# Altium footprint library lib_datalogger.PcbLib: 866 footprints (part 4 of 55)
Each footprint in its own frame and in the unit in brackets; x right, y up, seen from the top. Pads: shape width x height; smd on the part's side, far side on the other; paste and mask are expansions set on the pad; w line width, h text height; cw(c..) or ccw(c..) is an arc to the next point about the centre after c.
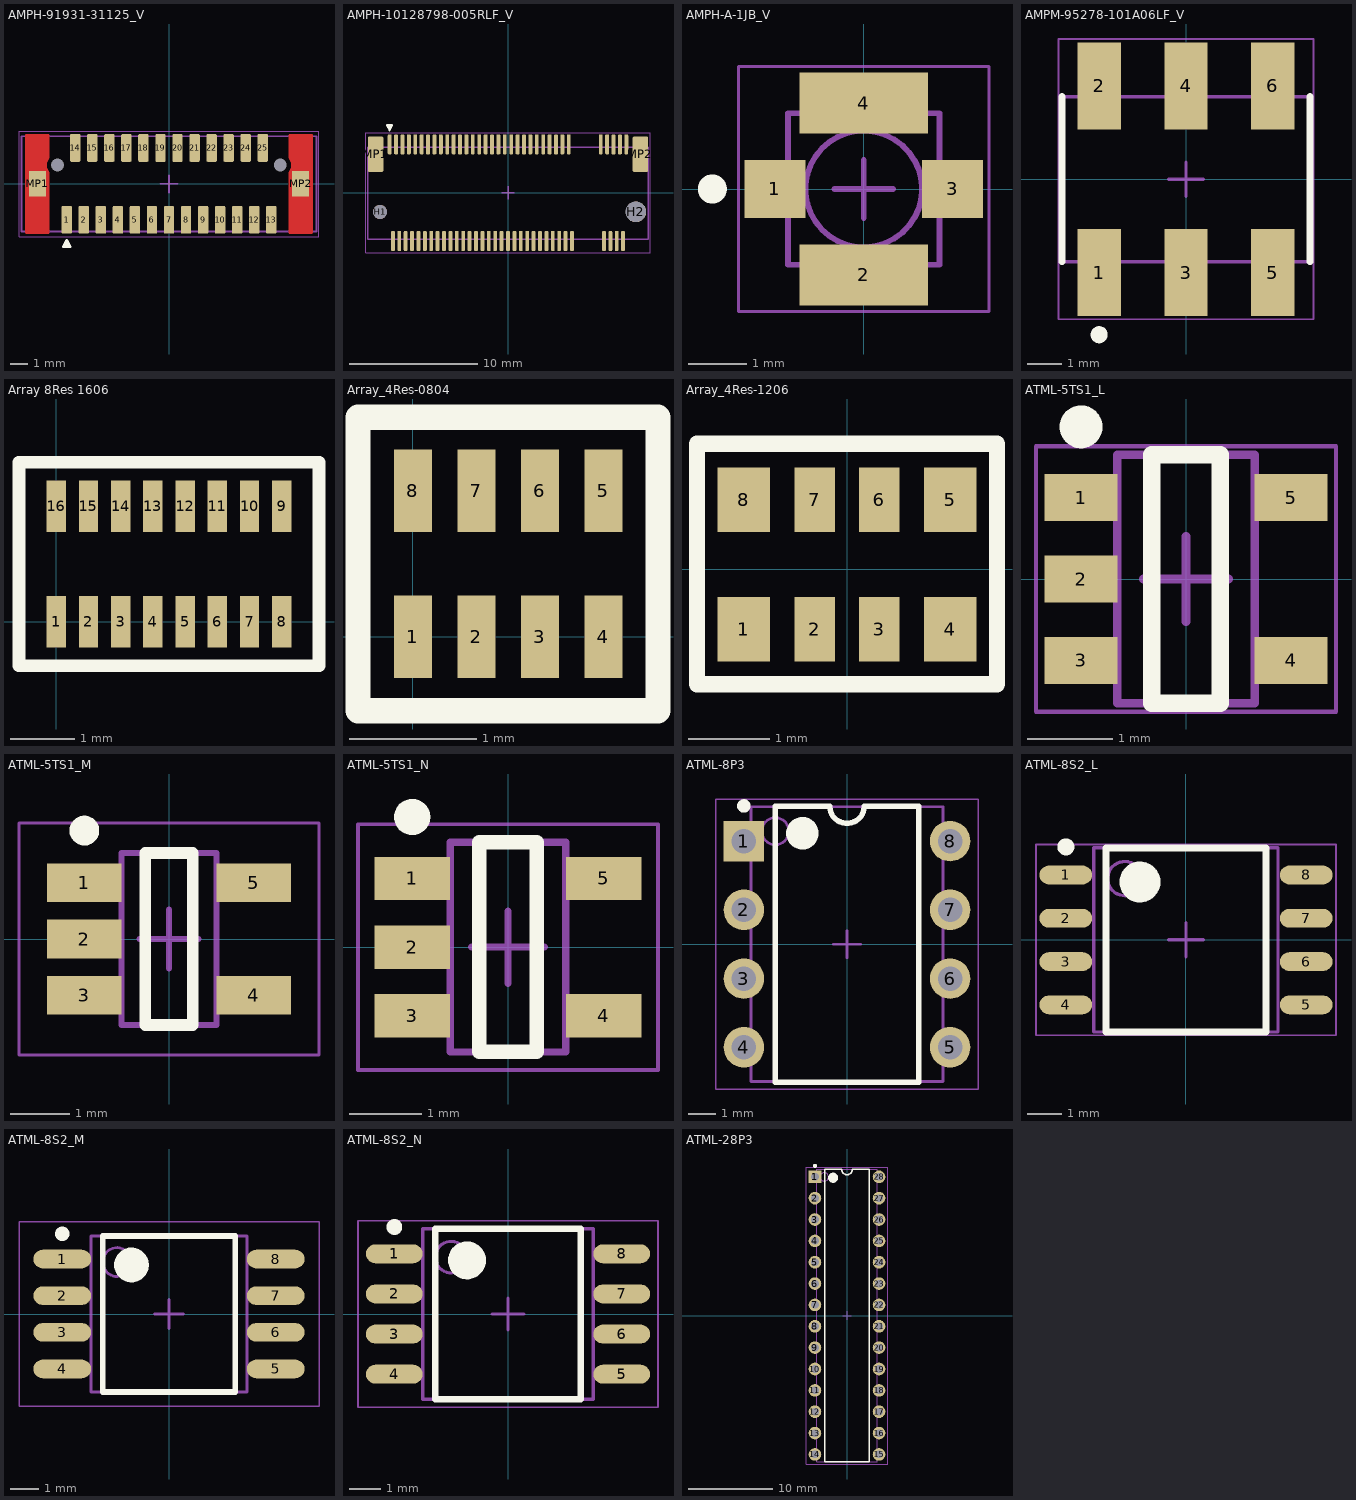
[diagram p3: the footprints below, top view; thin cyan lines are the x and y axes]

## AMPH-91931-31125_V [mm] "SMD, 25-Leads, Body 5.59x17.3mm, Pitch 1mm"
height 4.15
pads (29):
  rrect25% 0.61x1.63 smd paste-0.61: 1(-6,-2.11) 2(-5,-2.11) 3(-4,-2.11) 4(-3,-2.11) 5(-2,-2.11) 6(-1,-2.11) 7(0,-2.11) 8(1,-2.11) 9(2,-2.11) 10(3,-2.11) 11(4,-2.11) 12(5,-2.11) 13(6,-2.11) 14(-5.5,2.11) 15(-4.5,2.11) 16(-3.5,2.11) 17(-2.5,2.11) 18(-1.5,2.11) 19(-0.5,2.11) 20(0.5,2.11) 21(1.5,2.11) 22(2.5,2.11) 23(3.5,2.11) 24(4.5,2.11) 25(5.5,2.11)
  round 0 hole 0.76 unplated: H1(-6.528,1.1) H2(6.528,1.1)
  rect 1x1.5 smd paste-0.61: MP1(-7.72,0) MP2(7.72,0)
Top Layer:
  region: -8.42,2.855 -8.42,-2.855 -8.42,-2.869 -8.409,-2.895 -8.39,-2.914 -8.364,-2.925 -8.35,-2.925 -7.1,-2.925 -7.084,-2.925 -7.055,-2.913 -7.032,-2.89 -7.02,-2.861 -7.02,-2.845 -7.02,0.689 -7.084,0.78 -7.159,0.989 -7.159,1.211 -7.083,1.419 -7.019,1.511 -7.02,2.845 -7.02,2.861 -7.032,2.89 -7.055,2.913 -7.084,2.925 -7.1,2.925 -8.35,2.925 -8.364,2.925 -8.39,2.914 -8.409,2.895 -8.42,2.869
  region: 8.42,2.855 8.42,-2.855 8.42,-2.869 8.409,-2.895 8.39,-2.914 8.364,-2.925 8.35,-2.925 7.1,-2.925 7.084,-2.925 7.055,-2.913 7.032,-2.89 7.02,-2.861 7.02,-2.845 7.02,0.689 7.084,0.78 7.159,0.989 7.159,1.211 7.083,1.419 7.019,1.511 7.02,2.845 7.02,2.861 7.032,2.89 7.055,2.913 7.084,2.925 7.1,2.925 8.35,2.925 8.364,2.925 8.39,2.914 8.409,2.895 8.42,2.869
Top Overlay:
  region: -6.2,-3.7 -5.8,-3.7 -6,-3.3
  lines w0.15: -6.2,-3.7 -5.8,-3.7 -6,-3.3 -6.2,-3.7
Top Paste:
  rectangle: 5.245,1.405 5.755,2.925
  rectangle: 4.245,1.405 4.755,2.925
  rectangle: 3.245,1.405 3.755,2.925
  rectangle: 2.245,1.405 2.755,2.925
  rectangle: 1.245,1.405 1.755,2.925
  rectangle: 0.245,1.405 0.755,2.925
  rectangle: -0.755,1.405 -0.245,2.925
  rectangle: -1.755,1.405 -1.245,2.925
  rectangle: -2.755,1.405 -2.245,2.925
  rectangle: -3.755,1.405 -3.245,2.925
  rectangle: -4.755,1.405 -4.245,2.925
  rectangle: 5.745,-2.925 6.255,-1.405
  rectangle: 4.745,-2.925 5.255,-1.405
  rectangle: 3.745,-2.925 4.255,-1.405
  rectangle: 2.745,-2.925 3.255,-1.405
  rectangle: 1.745,-2.925 2.255,-1.405
  rectangle: 0.745,-2.925 1.255,-1.405
  rectangle: -0.255,-2.925 0.255,-1.405
  rectangle: -1.255,-2.925 -0.745,-1.405
  rectangle: -2.255,-2.925 -1.745,-1.405
  rectangle: -3.255,-2.925 -2.745,-1.405
  rectangle: -4.255,-2.925 -3.745,-1.405
  rectangle: -5.255,-2.925 -4.745,-1.405
  rectangle: -5.755,1.405 -5.245,2.925
  rectangle: -6.255,-2.925 -5.745,-1.405
  region: -8.42,2.925 -7.53,2.925 -7.53,-2.925 -8.42,-2.925
  region: 8.42,2.925 7.53,2.925 7.53,-2.925 8.42,-2.925
Mechanical 13:
  lines w0.1: -8.65,-2.795 -8.65,2.795 8.65,2.795 8.65,-2.795 -8.65,-2.795
Mechanical 15:
  lines w0.05: -8.8,-3.1 8.8,-3.1 8.8,3.1 -8.8,3.1 -8.8,-3.1
  lines w0.1: -0.5,0 0.5,0 ; 0,-0.5 0,0.5
Top Designator:
  text ".Designator" at -1.27,-0.127 h0.6
3D body "91920-31125.stp": height 3.28, standoff 0, extent -8.65,-2.795 8.65,2.795

## AMPH-10128798-005RLF_V [mm] "SMD, 67-Leads, Body 21.9x7.2mm, Pitch 0.5mm"
height 5.8
pads (71):
  rrect50% 0.3x1.55 smd: 1(-9.25,3.775) 2(-9,-3.775) 3(-8.75,3.775) 4(-8.5,-3.775) 5(-8.25,3.775) 6(-8,-3.775) 7(-7.75,3.775) 8(-7.5,-3.775) 9(-7.25,3.775) 10(-7,-3.775) 11(-6.75,3.775) 12(-6.5,-3.775) 13(-6.25,3.775) 14(-6,-3.775) 15(-5.75,3.775) 16(-5.5,-3.775) 17(-5.25,3.775) 18(-5,-3.775) 19(-4.75,3.775) 20(-4.5,-3.775) 21(-4.25,3.775) 22(-4,-3.775) 23(-3.75,3.775) 24(-3.5,-3.775) 25(-3.25,3.775) 26(-3,-3.775) 27(-2.75,3.775) 28(-2.5,-3.775) 29(-2.25,3.775) 30(-2,-3.775) 31(-1.75,3.775) 32(-1.5,-3.775) 33(-1.25,3.775) 34(-1,-3.775) 35(-0.75,3.775) 36(-0.5,-3.775) 37(-0.25,3.775) 38(0,-3.775) 39(0.25,3.775) 40(0.5,-3.775) 41(0.75,3.775) 42(1,-3.775) 43(1.25,3.775) 44(1.5,-3.775) 45(1.75,3.775) 46(2,-3.775) 47(2.25,3.775) 48(2.5,-3.775) 49(2.75,3.775) 50(3,-3.775) 51(3.25,3.775) 52(3.5,-3.775) 53(3.75,3.775) 54(4,-3.775) 55(4.25,3.775) 56(4.5,-3.775) 57(4.75,3.775) 58(5,-3.775) 67(7.25,3.775) 68(7.5,-3.775) 69(7.75,3.775) 70(8,-3.775) 71(8.25,3.775) 72(8.5,-3.775) 73(8.75,3.775) 74(9,-3.775) 75(9.25,3.775)
  round 1.1 hole 1.1 unplated mask+0.102: H1(-10,-1.5)
  round 1.6 hole 1.6 unplated mask+0.102: H2(10,-1.5)
  rrect15% 1.2x2.75 smd: MP1(-10.35,3) MP2(10.35,3)
Top Overlay:
  region: -9.05,5.275 -9.45,5.275 -9.25,4.875
  lines w0.15: -9.45,5.275 -9.05,5.275 -9.25,4.875 -9.45,5.275
Mechanical 13:
  lines w0.1: -10.95,-3.65 10.95,-3.65 10.95,3.55 -10.95,3.55 -10.95,-3.65
Mechanical 15:
  lines w0.05: -11.1,-4.7 11.1,-4.7 11.1,4.7 -11.1,4.7 -11.1,-4.7
  lines w0.1: -0.5,0 0.5,0 ; 0,-0.5 0,0.5
Top Designator:
  text ".Designator" at -1.27,-0.127 h0.6
3D body "10128798.stp": height 5.5, standoff -0.45, extent -10.95,-4.1 10.95,4.049

## AMPH-A-1JB_V [mm] "SMD, 4-Leads, Body 2.6x2.6mm"
height 1.35
pads (4):
  rect 1.05x1 smd: 1(-1.525,0) 3(1.525,0)
  rect 2.2x1.05 smd: 2(0,-1.475) 4(0,1.475)
Top Overlay:
  circle w0.25: c-2.6,0 r0.125
Mechanical 13:
  circle w0.1: c0,0 r1
  lines w0.1: -1.3,-1.3 -1.3,1.3 1.3,1.3 1.3,-1.3 -1.3,-1.3
Mechanical 15:
  lines w0.05: -2.15,-2.1 2.15,-2.1 2.15,2.1 -2.15,2.1 -2.15,-2.1
  lines w0.1: -0.5,0 0.5,0 ; 0,-0.5 0,0.5
3D body: height 1, standoff 0.1, extent -0.254,-0.254 0.254,0.254
3D body: height 1.35, standoff 0.1, extent -1.141,-1.102 1.088,1.126
3D body: height 1.35, standoff 0.1, extent -1.139,-1.104 1.09,1.124
3D body: height 0.35, standoff 0, extent -1.299,-1.3 1.3,1.299

## AMPM-95278-101A06LF_V [mm] "SMD, 6-Leads, Body 7.26x4.83mm, Pitch 2.54mm"
height 14.4
pads (6):
  rect 1.27x2.54 smd: 1(-2.54,-2.73) 2(-2.54,2.73) 3(0,-2.73) 4(0,2.73) 5(2.54,-2.73) 6(2.54,2.73)
Top Overlay:
  circle w0.25: c-2.54,-4.55 r0.125
  lines w0.2: -3.63,-2.415 -3.63,2.415 ; 3.63,-2.415 3.63,2.415
Mechanical 13:
  lines w0.1: -3.63,-2.415 3.63,-2.415 3.63,2.415 -3.63,2.415 -3.63,-2.415
Mechanical 15:
  lines w0.05: -3.73,-4.1 3.73,-4.1 3.73,4.1 -3.73,4.1 -3.73,-4.1
  lines w0.1: -0.5,0 0.5,0 ; 0,-0.5 0,0.5
3D body "95278_y01_06_asm.stp": height 9.71, standoff 0.05, extent -3.61,-3.643 3.61,3.643

## ANTENNA_RF_RPA-SMA_RIGHT_ANGLE [mm]
3D body "ANT-916-CW-RCS--3DModel-STEP-418109.STEP": height 53, standoff 0, extent -6.022,-9.929 3.378,7.491

## Array 8Res 1606 [mm]
height 0.7
pads (16):
  rect 0.3x0.8 smd: 1(0,0) 2(0.5,0) 3(1,0) 4(1.5,0) 5(2,0) 6(2.5,0) 7(3,0) 8(3.5,0) 9(3.5,1.8) 10(3,1.8) 11(2.5,1.8) 12(2,1.8) 13(1.5,1.8) 14(1,1.8) 15(0.5,1.8) 16(0,1.8)
Top Overlay:
  lines w0.2: -0.579,-0.679 -0.579,2.479 4.079,2.479 4.079,-0.679 -0.579,-0.679
3D body "array YC248.step": height 0.45, standoff 0, extent -0.25,0.1 3.75,1.7

## Array_4Res-0804 [mm]
height 0.7
pads (8):
  rect 0.3x0.65 smd: 1(0,0) 2(0.5,0) 3(1,0) 4(1.5,0) 5(1.5,1.15) 6(1,1.15) 7(0.5,1.15) 8(0,1.15)
Top Overlay:
  lines w0.2: -0.432,-0.584 1.93,-0.584 1.93,1.727 -0.432,1.727 -0.432,-0.584
3D body "YC124.step": height 0.45, standoff 0, extent -0.251,0.071 1.749,1.072

## Array_4Res-1206 [mm]
height 0.7
pads (8):
  rect 0.65x0.8 smd: 1(-1.276,-0.743) 4(1.274,-0.743) 5(1.274,0.857) 8(-1.276,0.857)
  rect 0.5x0.8 smd: 2(-0.401,-0.743) 3(0.399,-0.743) 6(0.399,0.857) 7(-0.401,0.857)
Top Overlay:
  lines w0.2: -1.854,-1.422 -1.854,1.549 1.854,1.549 1.854,-1.422 -1.854,-1.422
3D body "User Library-Array-1206-4Way-Var2-1.STEP": height 0.5, standoff 0, extent -1.601,-0.743 1.599,0.857

## ATML-5TS1_L [mm] "SOT23, 5-Leads, Body 2.9x1.6mm, Pitch 0.95mm, IPC High Density"
height 1
pads (5):
  rect 0.85x0.55 smd: 1(-1.225,0.95) 2(-1.225,0) 3(-1.225,-0.95) 4(1.225,-0.95) 5(1.225,0.95)
Top Overlay:
  circle w0.25: c-1.225,1.775 r0.125
  lines w0.2: -0.4,-1.45 0.4,-1.45 0.4,1.45 -0.4,1.45 -0.4,-1.45
Mechanical 13:
  lines w0.1: -0.8,-1.45 -0.8,1.45 0.8,1.45 0.8,-1.45 -0.8,-1.45
Mechanical 15:
  lines w0.05: -1.75,-1.55 -1.75,1.55 1.75,1.55 1.75,-1.55 -1.75,-1.55
  lines w0.1: -0.5,0 0.5,0 ; 0,-0.5 0,0.5
3D body "SOT95P280X100-5L.step": height 1, standoff -0.02, extent -1.5,-1.45 1.5,1.45

## ATML-5TS1_M [mm] "SOT23, 5-Leads, Body 2.9x1.6mm, Pitch 0.95mm, IPC Low Density"
height 1
pads (5):
  rect 1.25x0.65 smd: 1(-1.425,0.95) 2(-1.425,0) 3(-1.425,-0.95) 4(1.425,-0.95) 5(1.425,0.95)
Top Overlay:
  circle w0.25: c-1.425,1.825 r0.125
  lines w0.2: -0.4,-1.45 -0.4,1.45 0.4,1.45 0.4,-1.45 -0.4,-1.45
Mechanical 13:
  lines w0.1: -0.8,-1.45 0.8,-1.45 0.8,1.45 -0.8,1.45 -0.8,-1.45
Mechanical 15:
  lines w0.05: -2.525,-1.95 2.525,-1.95 2.525,1.95 -2.525,1.95 -2.525,-1.95
  lines w0.1: -0.5,0 0.5,0 ; 0,-0.5 0,0.5
3D body "SOT95P280X100-5M.step": height 1, standoff -0.02, extent -1.5,-1.45 1.5,1.45

## ATML-5TS1_N [mm] "SOT23, 5-Leads, Body 2.9x1.6mm, Pitch 0.95mm, IPC Medium Density"
height 1
pads (5):
  rect 1.05x0.6 smd: 1(-1.325,0.95) 2(-1.325,0) 3(-1.325,-0.95) 4(1.325,-0.95) 5(1.325,0.95)
Top Overlay:
  circle w0.25: c-1.325,1.8 r0.125
  lines w0.2: -0.4,-1.45 -0.4,1.45 0.4,1.45 0.4,-1.45 -0.4,-1.45
Mechanical 13:
  lines w0.1: -0.8,-1.45 0.8,-1.45 0.8,1.45 -0.8,1.45 -0.8,-1.45
Mechanical 15:
  lines w0.05: -2.075,-1.7 2.075,-1.7 2.075,1.7 -2.075,1.7 -2.075,-1.7
  lines w0.1: -0.5,0 0.5,0 ; 0,-0.5 0,0.5
3D body "SOT95P280X100-5N.step": height 1, standoff -0.02, extent -1.5,-1.45 1.5,1.45

## ATML-8P3 [mm] "DIP, 8-Leads, Body 10.15x7.1mm, Pitch 2.54mm"
height 5.34
pads (8):
  rect 1.5x1.5 hole 0.9: 1(-3.81,3.81)
  round 1.5 hole 0.9: 2(-3.81,1.27) 3(-3.81,-1.27) 4(-3.81,-3.81) 5(3.81,-3.81) 6(3.81,-1.27) 7(3.81,1.27) 8(3.81,3.81)
Top Overlay:
  circle w0.6: c-1.65,4.1 r0.3
  circle w0.25: c-3.81,5.11 r0.125
  lines w0.2: -2.65,-5.1 2.65,-5.1 2.65,5.1 0.635,5.1 cw(c0,5.1) -0.635,5.1 -2.65,5.1 -2.65,-5.1
Mechanical 13:
  circle w0.1: c-2.65,4.175 r0.5
  lines w0.1: -3.55,-5.075 3.55,-5.075 3.55,5.075 -3.55,5.075 -3.55,-5.075
Mechanical 15:
  lines w0.05: -4.85,-5.35 4.85,-5.35 4.85,5.35 -4.85,5.35 -4.85,-5.35
  lines w0.1: -0.5,0 0.5,0 ; 0,-0.5 0,0.5
3D body: height 5.34, standoff 0.38, extent -3.55,-5.075 3.55,5.075
3D body: height 0, standoff -1.6, extent 3.675,3.45 3.945,4.17
3D body: height 3, standoff 2.72, extent 3.55,3.31 3.945,4.31
3D body: height 2.73, standoff 0, extent 3.675,3.31 3.945,4.31
3D body: height 0, standoff -1.6, extent 3.675,0.91 3.945,1.63
3D body: height 3, standoff 2.72, extent 3.55,0.77 3.945,1.77
3D body: height 2.73, standoff 0, extent 3.675,0.77 3.945,1.77
3D body: height 0, standoff -1.6, extent 3.675,-1.63 3.945,-0.91
3D body: height 3, standoff 2.72, extent 3.55,-1.77 3.945,-0.77
3D body: height 2.73, standoff 0, extent 3.675,-1.77 3.945,-0.77
3D body: height 0, standoff -1.6, extent 3.675,-4.17 3.945,-3.45
3D body: height 3, standoff 2.72, extent 3.55,-4.31 3.945,-3.31
3D body: height 2.73, standoff 0, extent 3.675,-4.31 3.945,-3.31
3D body: height 0, standoff -1.6, extent -3.945,-4.17 -3.675,-3.45
3D body: height 3, standoff 2.72, extent -3.945,-4.31 -3.55,-3.31
3D body: height 2.73, standoff 0, extent -3.945,-4.31 -3.675,-3.31
3D body: height 0, standoff -1.6, extent -3.945,-1.63 -3.675,-0.91
3D body: height 3, standoff 2.72, extent -3.945,-1.77 -3.55,-0.77
3D body: height 2.73, standoff 0, extent -3.945,-1.77 -3.675,-0.77
3D body: height 0, standoff -1.6, extent -3.945,0.91 -3.675,1.63
3D body: height 3, standoff 2.72, extent -3.945,0.77 -3.55,1.77
3D body: height 2.73, standoff 0, extent -3.945,0.77 -3.675,1.77
3D body: height 0, standoff -1.6, extent -3.945,3.45 -3.675,4.17
3D body: height 3, standoff 2.72, extent -3.945,3.31 -3.55,4.31
3D body: height 2.73, standoff 0, extent -3.945,3.31 -3.675,4.31

## ATML-8S2_L [mm] "SOIC, 8-Leads, Body 5.4x5.4mm, Pitch 1.27mm, IPC High Density"
height 2.16
pads (8):
  oval 1.55x0.55 smd: 1(-3.525,1.905) 2(-3.525,0.635) 3(-3.525,-0.635) 4(-3.525,-1.905) 5(3.525,-1.905) 6(3.525,-0.635) 7(3.525,0.635) 8(3.525,1.905)
Top Overlay:
  circle w0.25: c-3.525,2.73 r0.125
  circle w0.6: c-1.35,1.7 r0.3
  lines w0.2: -2.35,-2.7 -2.35,2.7 2.35,2.7 2.35,-2.7 -2.35,-2.7
Mechanical 13:
  circle w0.1: c-1.8,1.8 r0.5
  lines w0.1: -2.7,-2.7 -2.7,2.7 2.7,2.7 2.7,-2.7 -2.7,-2.7
Mechanical 15:
  lines w0.05: -4.4,-2.8 -4.4,2.8 4.4,2.8 4.4,-2.8 -4.4,-2.8
  lines w0.1: -0.5,0 0.5,0 ; 0,-0.5 0,0.5
3D body "SOIC127P800X216-8L.step": height 2.16, standoff 0, extent -3.99,-2.7 3.99,2.7

## ATML-8S2_M [mm] "SOIC, 8-Leads, Body 5.4x5.4mm, Pitch 1.27mm, IPC Low Density"
height 2.16
pads (8):
  oval 2x0.65 smd: 1(-3.7,1.905) 2(-3.7,0.635) 3(-3.7,-0.635) 4(-3.7,-1.905) 5(3.7,-1.905) 6(3.7,-0.635) 7(3.7,0.635) 8(3.7,1.905)
Top Overlay:
  circle w0.25: c-3.7,2.78 r0.125
  circle w0.6: c-1.3,1.7 r0.3
  lines w0.2: -2.3,-2.7 -2.3,2.7 2.3,2.7 2.3,-2.7 -2.3,-2.7
Mechanical 13:
  circle w0.1: c-1.8,1.8 r0.5
  lines w0.1: -2.7,-2.7 -2.7,2.7 2.7,2.7 2.7,-2.7 -2.7,-2.7
Mechanical 15:
  lines w0.05: -5.2,-3.2 -5.2,3.2 5.2,3.2 5.2,-3.2 -5.2,-3.2
  lines w0.1: -0.5,0 0.5,0 ; 0,-0.5 0,0.5
3D body "SOIC127P800X216-8L.step": height 2.16, standoff 0, extent -3.99,-2.7 3.99,2.7

## ATML-8S2_N [mm] "SOIC, 8-Leads, Body 5.4x5.4mm, Pitch 1.27mm, IPC Medium Density"
height 2.16
pads (8):
  oval 1.8x0.6 smd: 1(-3.6,1.905) 2(-3.6,0.635) 3(-3.6,-0.635) 4(-3.6,-1.905) 5(3.6,-1.905) 6(3.6,-0.635) 7(3.6,0.635) 8(3.6,1.905)
Top Overlay:
  circle w0.25: c-3.6,2.755 r0.125
  circle w0.6: c-1.3,1.7 r0.3
  lines w0.2: -2.3,-2.7 -2.3,2.7 2.3,2.7 2.3,-2.7 -2.3,-2.7
Mechanical 13:
  circle w0.1: c-1.8,1.8 r0.5
  lines w0.1: -2.7,-2.7 -2.7,2.7 2.7,2.7 2.7,-2.7 -2.7,-2.7
Mechanical 15:
  lines w0.05: -4.75,-2.95 -4.75,2.95 4.75,2.95 4.75,-2.95 -4.75,-2.95
  lines w0.1: -0.5,0 0.5,0 ; 0,-0.5 0,0.5
3D body "SOIC127P800X216-8L.step": height 2.16, standoff 0, extent -3.99,-2.7 3.99,2.7

## ATML-28P3 [mm] "DIP, 28-Leads, Body 34.8x7.2mm, Pitch 2.54mm"
height 4.58
pads (28):
  rect 1.5x1.5 hole 0.9: 1(-3.81,16.51)
  round 1.5 hole 0.9: 2(-3.81,13.97) 3(-3.81,11.43) 4(-3.81,8.89) 5(-3.81,6.35) 6(-3.81,3.81) 7(-3.81,1.27) 8(-3.81,-1.27) 9(-3.81,-3.81) 10(-3.81,-6.35) 11(-3.81,-8.89) 12(-3.81,-11.43) 13(-3.81,-13.97) 14(-3.81,-16.51) 15(3.81,-16.51) 16(3.81,-13.97) 17(3.81,-11.43) 18(3.81,-8.89) 19(3.81,-6.35) 20(3.81,-3.81) 21(3.81,-1.27) 22(3.81,1.27) 23(3.81,3.81) 24(3.81,6.35) 25(3.81,8.89) 26(3.81,11.43) 27(3.81,13.97) 28(3.81,16.51)
Top Overlay:
  circle w0.6: c-1.65,16.4 r0.3
  circle w0.25: c-3.81,17.81 r0.125
  lines w0.2: -2.65,-17.4 2.65,-17.4 2.65,17.4 0.635,17.4 cw(c0,17.4) -0.635,17.4 -2.65,17.4 -2.65,-17.4
Mechanical 13:
  circle w0.1: c-2.7,16.5 r0.5
  lines w0.1: -3.6,-17.4 3.6,-17.4 3.6,17.4 -3.6,17.4 -3.6,-17.4
Mechanical 15:
  lines w0.05: -4.85,-17.65 4.85,-17.65 4.85,17.65 -4.85,17.65 -4.85,-17.65
  lines w0.1: -0.5,0 0.5,0 ; 0,-0.5 0,0.5
3D body: height 4.58, standoff 0.51, extent -3.6,-17.4 3.6,17.4
3D body: height 0, standoff -1.6, extent 3.675,16.15 3.945,16.87
3D body: height 2.68, standoff 2.41, extent 3.6,16.01 3.945,17.01
3D body: height 2.41, standoff 0, extent 3.675,16.01 3.945,17.01
3D body: height 0, standoff -1.6, extent 3.675,13.61 3.945,14.33
3D body: height 2.68, standoff 2.41, extent 3.6,13.47 3.945,14.47
3D body: height 2.41, standoff 0, extent 3.675,13.47 3.945,14.47
3D body: height 0, standoff -1.6, extent 3.675,11.07 3.945,11.79
3D body: height 2.68, standoff 2.41, extent 3.6,10.93 3.945,11.93
3D body: height 2.41, standoff 0, extent 3.675,10.93 3.945,11.93
3D body: height 0, standoff -1.6, extent 3.675,8.53 3.945,9.25
3D body: height 2.68, standoff 2.41, extent 3.6,8.39 3.945,9.39
3D body: height 2.41, standoff 0, extent 3.675,8.39 3.945,9.39
3D body: height 0, standoff -1.6, extent 3.675,5.99 3.945,6.71
3D body: height 2.68, standoff 2.41, extent 3.6,5.85 3.945,6.85
3D body: height 2.41, standoff 0, extent 3.675,5.85 3.945,6.85
3D body: height 0, standoff -1.6, extent 3.675,3.45 3.945,4.17
3D body: height 2.68, standoff 2.41, extent 3.6,3.31 3.945,4.31
3D body: height 2.41, standoff 0, extent 3.675,3.31 3.945,4.31
3D body: height 0, standoff -1.6, extent 3.675,0.91 3.945,1.63
3D body: height 2.68, standoff 2.41, extent 3.6,0.77 3.945,1.77
3D body: height 2.41, standoff 0, extent 3.675,0.77 3.945,1.77
3D body: height 0, standoff -1.6, extent 3.675,-1.63 3.945,-0.91
3D body: height 2.68, standoff 2.41, extent 3.6,-1.77 3.945,-0.77
3D body: height 2.41, standoff 0, extent 3.675,-1.77 3.945,-0.77
3D body: height 0, standoff -1.6, extent 3.675,-4.17 3.945,-3.45
3D body: height 2.68, standoff 2.41, extent 3.6,-4.31 3.945,-3.31
3D body: height 2.41, standoff 0, extent 3.675,-4.31 3.945,-3.31
3D body: height 0, standoff -1.6, extent 3.675,-6.71 3.945,-5.99
3D body: height 2.68, standoff 2.41, extent 3.6,-6.85 3.945,-5.85
3D body: height 2.41, standoff 0, extent 3.675,-6.85 3.945,-5.85
3D body: height 0, standoff -1.6, extent 3.675,-9.25 3.945,-8.53
3D body: height 2.68, standoff 2.41, extent 3.6,-9.39 3.945,-8.39
3D body: height 2.41, standoff 0, extent 3.675,-9.39 3.945,-8.39
3D body: height 0, standoff -1.6, extent 3.675,-11.79 3.945,-11.07
3D body: height 2.68, standoff 2.41, extent 3.6,-11.93 3.945,-10.93
3D body: height 2.41, standoff 0, extent 3.675,-11.93 3.945,-10.93
3D body: height 0, standoff -1.6, extent 3.675,-14.33 3.945,-13.61
3D body: height 2.68, standoff 2.41, extent 3.6,-14.47 3.945,-13.47
3D body: height 2.41, standoff 0, extent 3.675,-14.47 3.945,-13.47
3D body: height 0, standoff -1.6, extent 3.675,-16.87 3.945,-16.15
3D body: height 2.68, standoff 2.41, extent 3.6,-17.01 3.945,-16.01
3D body: height 2.41, standoff 0, extent 3.675,-17.01 3.945,-16.01
3D body: height 0, standoff -1.6, extent -3.945,-16.87 -3.675,-16.15
3D body: height 2.68, standoff 2.41, extent -3.945,-17.01 -3.6,-16.01
3D body: height 2.41, standoff 0, extent -3.945,-17.01 -3.675,-16.01
3D body: height 0, standoff -1.6, extent -3.945,-14.33 -3.675,-13.61
3D body: height 2.68, standoff 2.41, extent -3.945,-14.47 -3.6,-13.47
3D body: height 2.41, standoff 0, extent -3.945,-14.47 -3.675,-13.47
3D body: height 0, standoff -1.6, extent -3.945,-11.79 -3.675,-11.07
3D body: height 2.68, standoff 2.41, extent -3.945,-11.93 -3.6,-10.93
3D body: height 2.41, standoff 0, extent -3.945,-11.93 -3.675,-10.93
3D body: height 0, standoff -1.6, extent -3.945,-9.25 -3.675,-8.53
3D body: height 2.68, standoff 2.41, extent -3.945,-9.39 -3.6,-8.39
3D body: height 2.41, standoff 0, extent -3.945,-9.39 -3.675,-8.39
3D body: height 0, standoff -1.6, extent -3.945,-6.71 -3.675,-5.99
3D body: height 2.68, standoff 2.41, extent -3.945,-6.85 -3.6,-5.85
3D body: height 2.41, standoff 0, extent -3.945,-6.85 -3.675,-5.85
3D body: height 0, standoff -1.6, extent -3.945,-4.17 -3.675,-3.45
3D body: height 2.68, standoff 2.41, extent -3.945,-4.31 -3.6,-3.31
3D body: height 2.41, standoff 0, extent -3.945,-4.31 -3.675,-3.31
3D body: height 0, standoff -1.6, extent -3.945,-1.63 -3.675,-0.91
3D body: height 2.68, standoff 2.41, extent -3.945,-1.77 -3.6,-0.77
3D body: height 2.41, standoff 0, extent -3.945,-1.77 -3.675,-0.77
3D body: height 0, standoff -1.6, extent -3.945,0.91 -3.675,1.63
3D body: height 2.68, standoff 2.41, extent -3.945,0.77 -3.6,1.77
3D body: height 2.41, standoff 0, extent -3.945,0.77 -3.675,1.77
3D body: height 0, standoff -1.6, extent -3.945,3.45 -3.675,4.17
3D body: height 2.68, standoff 2.41, extent -3.945,3.31 -3.6,4.31
3D body: height 2.41, standoff 0, extent -3.945,3.31 -3.675,4.31
3D body: height 0, standoff -1.6, extent -3.945,5.99 -3.675,6.71
3D body: height 2.68, standoff 2.41, extent -3.945,5.85 -3.6,6.85
3D body: height 2.41, standoff 0, extent -3.945,5.85 -3.675,6.85
3D body: height 0, standoff -1.6, extent -3.945,8.53 -3.675,9.25
3D body: height 2.68, standoff 2.41, extent -3.945,8.39 -3.6,9.39
3D body: height 2.41, standoff 0, extent -3.945,8.39 -3.675,9.39
3D body: height 0, standoff -1.6, extent -3.945,11.07 -3.675,11.79
3D body: height 2.68, standoff 2.41, extent -3.945,10.93 -3.6,11.93
3D body: height 2.41, standoff 0, extent -3.945,10.93 -3.675,11.93
3D body: height 0, standoff -1.6, extent -3.945,13.61 -3.675,14.33
3D body: height 2.68, standoff 2.41, extent -3.945,13.47 -3.6,14.47
3D body: height 2.41, standoff 0, extent -3.945,13.47 -3.675,14.47
3D body: height 0, standoff -1.6, extent -3.945,16.15 -3.675,16.87
3D body: height 2.68, standoff 2.41, extent -3.945,16.01 -3.6,17.01
3D body: height 2.41, standoff 0, extent -3.945,16.01 -3.675,17.01